# Altium footprint library MH_DA_THU_VIEN_16122016.PcbLib: 531 footprints (part 17 of 34)
Each footprint in its own frame and in the unit in brackets; x right, y up, seen from the top. Pads: shape width x height; smd on the part's side, far side on the other; paste and mask are expansions set on the pad; w line width, h text height; cw(c..) or ccw(c..) is an arc to the next point about the centre after c.
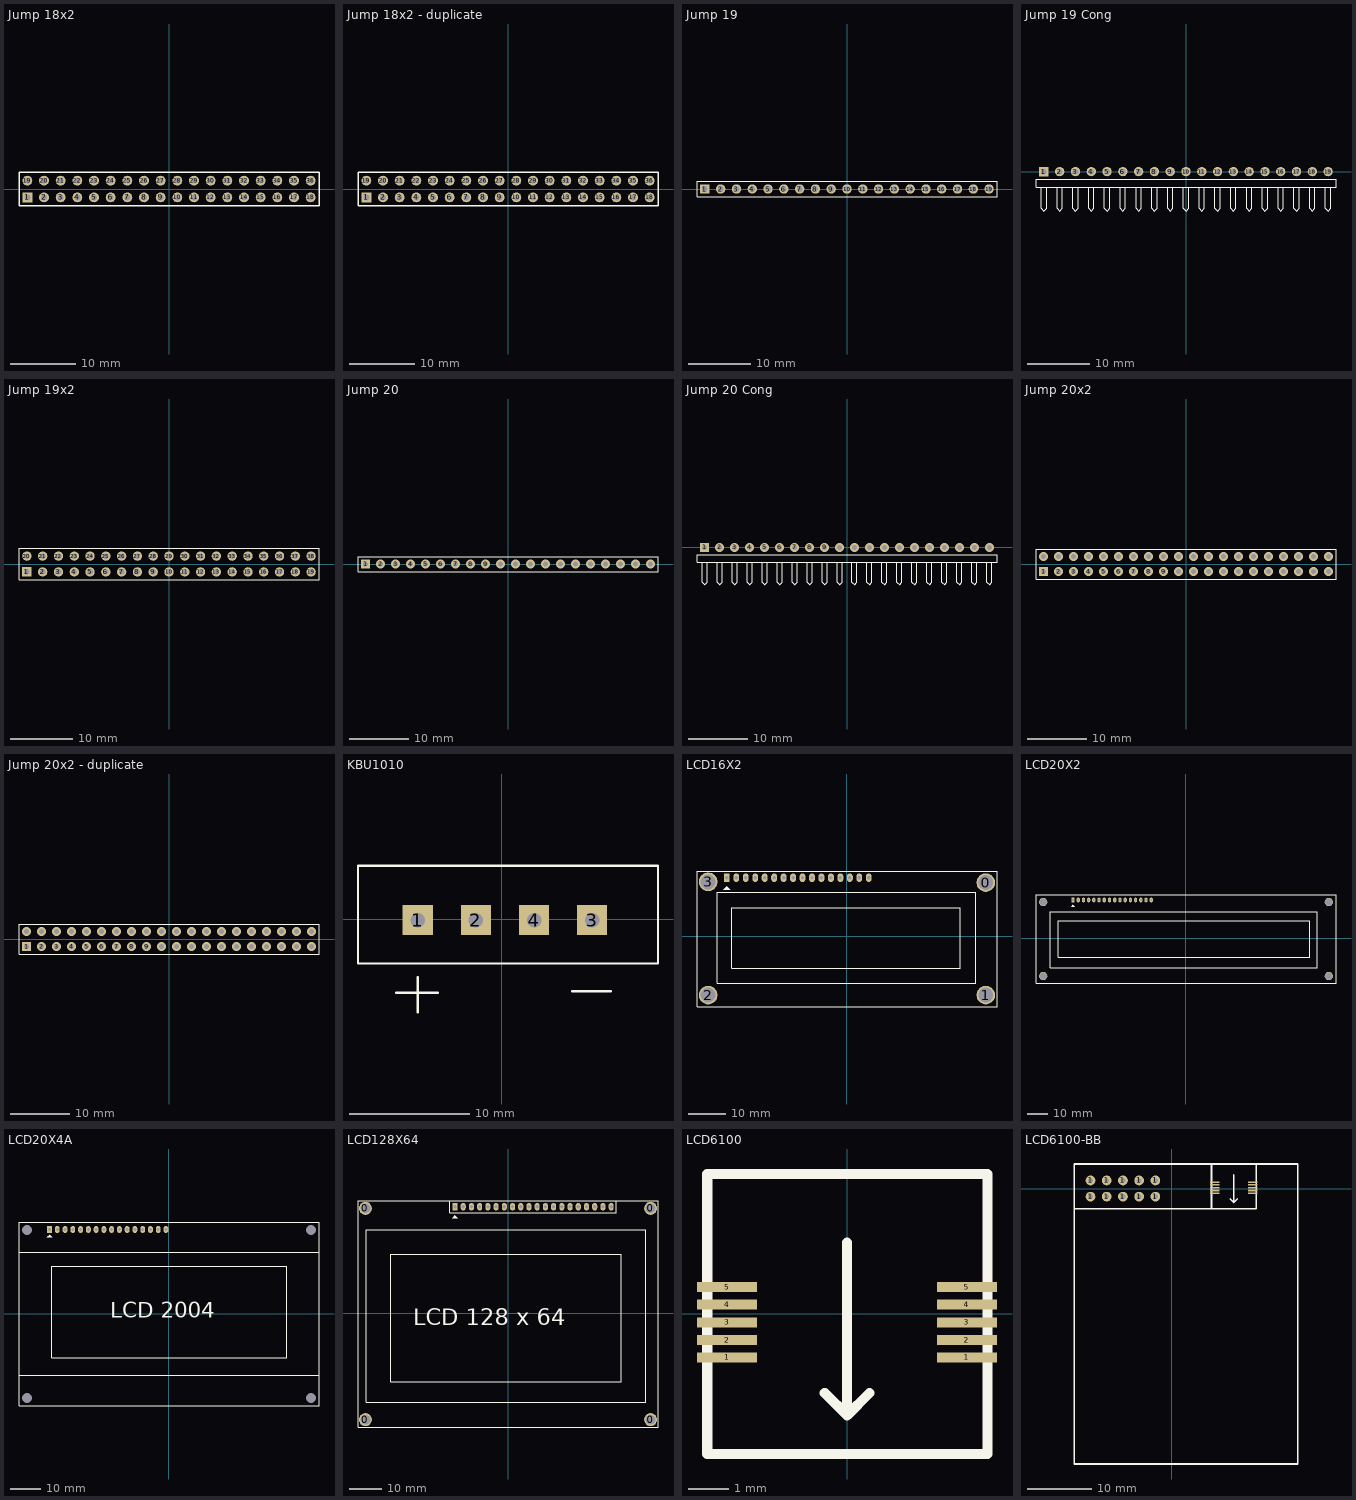
[diagram p16: the footprints below, top view; thin cyan lines are the x and y axes]

## Jump 18x2 [mm]
pads (36):
  rect 1.5x1.5 hole 0.9: 1(-21.59,-1.27)
  round 1.5 hole 0.9: 2(-19.05,-1.27) 3(-16.51,-1.27) 4(-13.97,-1.27) 5(-11.43,-1.27) 6(-8.89,-1.27) 7(-6.35,-1.27) 8(-3.81,-1.27) 9(-1.27,-1.27) 10(1.27,-1.27) 11(3.81,-1.27) 12(6.35,-1.27) 13(8.89,-1.27) 14(11.43,-1.27) 15(13.97,-1.27) 16(16.51,-1.27) 17(19.05,-1.27) 18(21.59,-1.27) 19(-21.59,1.27) 20(-19.05,1.27) 21(-16.51,1.27) 22(-13.97,1.27) 23(-11.43,1.27) 24(-8.89,1.27) 25(-6.35,1.27) 26(-3.81,1.27) 27(-1.27,1.27) 28(1.27,1.27) 29(3.81,1.27) 30(6.35,1.27) 31(8.89,1.27) 32(11.43,1.27) 33(13.97,1.27) 34(16.51,1.27) 35(19.05,1.27) 36(21.59,1.27)
Top Overlay:
  lines w0.2: -22.86,-2.54 -22.86,2.54 22.86,2.54 22.86,-2.54 -22.86,-2.54
3D body: height 1.5, standoff 0, extent 20.32,-2.54 22.86,0
3D body: height 1.5, standoff 0, extent 20.32,0 22.86,2.54
3D body: height 1.5, standoff 0, extent 15.24,-2.54 17.78,0
3D body: height 1.5, standoff 0, extent 15.24,0 17.78,2.54
3D body: height 1.5, standoff 0, extent 17.78,-2.54 20.32,0
3D body: height 1.5, standoff 0, extent 17.78,0 20.32,2.54
3D body: height 1.5, standoff 0, extent 10.16,-2.54 12.7,0
3D body: height 1.5, standoff 0, extent 10.16,0 12.7,2.54
3D body: height 1.5, standoff 0, extent 12.7,-2.54 15.24,0
3D body: height 1.5, standoff 0, extent 12.7,0 15.24,2.54
3D body: height 1.5, standoff 0, extent 5.08,-2.54 7.62,0
3D body: height 1.5, standoff 0, extent 5.08,0 7.62,2.54
3D body: height 1.5, standoff 0, extent 7.62,-2.54 10.16,0
3D body: height 1.5, standoff 0, extent 7.62,0 10.16,2.54
3D body: height 1.5, standoff 0, extent 2.54,0 5.08,2.54
3D body: height 1.5, standoff 0, extent 2.54,-2.54 5.08,0
3D body: height 1.5, standoff 0, extent 0,0 2.54,2.54
3D body: height 1.5, standoff 0, extent 0,-2.54 2.54,0
3D body: height 1.5, standoff 0, extent -2.54,0 0,2.54
3D body: height 1.5, standoff 0, extent -2.54,-2.54 0,0
3D body: height 1.5, standoff 0, extent -5.08,0 -2.54,2.54
3D body: height 1.5, standoff 0, extent -5.08,-2.54 -2.54,0
3D body: height 1.5, standoff 0, extent -7.62,0 -5.08,2.54
3D body: height 1.5, standoff 0, extent -7.62,-2.54 -5.08,0
3D body: height 1.5, standoff 0, extent -10.16,0 -7.62,2.54
3D body: height 1.5, standoff 0, extent -10.16,-2.54 -7.62,0
3D body: height 1.5, standoff 0, extent -12.7,0 -10.16,2.54
3D body: height 1.5, standoff 0, extent -12.7,-2.54 -10.16,0
3D body: height 1.5, standoff 0, extent -15.24,0 -12.7,2.54
3D body: height 1.5, standoff 0, extent -15.24,-2.54 -12.7,0
3D body: height 1.5, standoff 0, extent -17.78,0 -15.24,2.54
3D body: height 1.5, standoff 0, extent -17.78,-2.54 -15.24,0
3D body: height 1.5, standoff 0, extent -20.32,0 -17.78,2.54
3D body: height 1.5, standoff 0, extent -20.32,-2.54 -17.78,0
3D body: height 1.5, standoff 0, extent -22.86,0 -20.32,2.54
3D body: height 1.5, standoff 0, extent -22.86,-2.54 -20.32,0

## Jump 18x2 - duplicate [mm]
pads (36):
  rect 1.5x1.5 hole 0.9: 1(-21.59,-1.27)
  round 1.5 hole 0.9: 2(-19.05,-1.27) 3(-16.51,-1.27) 4(-13.97,-1.27) 5(-11.43,-1.27) 6(-8.89,-1.27) 7(-6.35,-1.27) 8(-3.81,-1.27) 9(-1.27,-1.27) 10(1.27,-1.27) 11(3.81,-1.27) 12(6.35,-1.27) 13(8.89,-1.27) 14(11.43,-1.27) 15(13.97,-1.27) 16(16.51,-1.27) 17(19.05,-1.27) 18(21.59,-1.27) 19(-21.59,1.27) 20(-19.05,1.27) 21(-16.51,1.27) 22(-13.97,1.27) 23(-11.43,1.27) 24(-8.89,1.27) 25(-6.35,1.27) 26(-3.81,1.27) 27(-1.27,1.27) 28(1.27,1.27) 29(3.81,1.27) 30(6.35,1.27) 31(8.89,1.27) 32(11.43,1.27) 33(13.97,1.27) 34(16.51,1.27) 35(19.05,1.27) 36(21.59,1.27)
Top Overlay:
  lines w0.2: -22.86,-2.54 -22.86,2.54 22.86,2.54 22.86,-2.54 -22.86,-2.54
3D body: height 1.5, standoff 0, extent 20.32,-2.54 22.86,0
3D body: height 1.5, standoff 0, extent 20.32,0 22.86,2.54
3D body: height 1.5, standoff 0, extent 15.24,-2.54 17.78,0
3D body: height 1.5, standoff 0, extent 15.24,0 17.78,2.54
3D body: height 1.5, standoff 0, extent 17.78,-2.54 20.32,0
3D body: height 1.5, standoff 0, extent 17.78,0 20.32,2.54
3D body: height 1.5, standoff 0, extent 10.16,-2.54 12.7,0
3D body: height 1.5, standoff 0, extent 10.16,0 12.7,2.54
3D body: height 1.5, standoff 0, extent 12.7,-2.54 15.24,0
3D body: height 1.5, standoff 0, extent 12.7,0 15.24,2.54
3D body: height 1.5, standoff 0, extent 5.08,-2.54 7.62,0
3D body: height 1.5, standoff 0, extent 5.08,0 7.62,2.54
3D body: height 1.5, standoff 0, extent 7.62,-2.54 10.16,0
3D body: height 1.5, standoff 0, extent 7.62,0 10.16,2.54
3D body: height 1.5, standoff 0, extent 2.54,0 5.08,2.54
3D body: height 1.5, standoff 0, extent 2.54,-2.54 5.08,0
3D body: height 1.5, standoff 0, extent 0,0 2.54,2.54
3D body: height 1.5, standoff 0, extent 0,-2.54 2.54,0
3D body: height 1.5, standoff 0, extent -2.54,0 0,2.54
3D body: height 1.5, standoff 0, extent -2.54,-2.54 0,0
3D body: height 1.5, standoff 0, extent -5.08,0 -2.54,2.54
3D body: height 1.5, standoff 0, extent -5.08,-2.54 -2.54,0
3D body: height 1.5, standoff 0, extent -7.62,0 -5.08,2.54
3D body: height 1.5, standoff 0, extent -7.62,-2.54 -5.08,0
3D body: height 1.5, standoff 0, extent -10.16,0 -7.62,2.54
3D body: height 1.5, standoff 0, extent -10.16,-2.54 -7.62,0
3D body: height 1.5, standoff 0, extent -12.7,0 -10.16,2.54
3D body: height 1.5, standoff 0, extent -12.7,-2.54 -10.16,0
3D body: height 1.5, standoff 0, extent -15.24,0 -12.7,2.54
3D body: height 1.5, standoff 0, extent -15.24,-2.54 -12.7,0
3D body: height 1.5, standoff 0, extent -17.78,0 -15.24,2.54
3D body: height 1.5, standoff 0, extent -17.78,-2.54 -15.24,0
3D body: height 1.5, standoff 0, extent -20.32,0 -17.78,2.54
3D body: height 1.5, standoff 0, extent -20.32,-2.54 -17.78,0
3D body: height 1.5, standoff 0, extent -22.86,0 -20.32,2.54
3D body: height 1.5, standoff 0, extent -22.86,-2.54 -20.32,0

## Jump 19 [mm]
pads (19):
  rect 1.5x1.5 hole 0.9: 1(-22.86,0)
  round 1.5 hole 0.9: 2(-20.32,0) 3(-17.78,0) 4(-15.24,0) 5(-12.7,0) 6(-10.16,0) 7(-7.62,0) 8(-5.08,0) 9(-2.54,0) 10(0,0) 11(2.54,0) 12(5.08,0) 13(7.62,0) 14(10.16,0) 15(12.7,0) 16(15.24,0) 17(17.78,0) 18(20.32,0) 19(22.86,0)
Top Overlay:
  lines w0.2: 14.605,1.27 14.817,1.27 ; -24.13,-1.27 -24.13,1.27 -22.225,1.27 24.13,1.27 24.13,-1.27 -24.13,-1.27
3D body: height 7, standoff -1, extent 14.834,-0.406 15.63,0.392
3D body: height 1.5, standoff 0, extent 13.97,-1.27 16.51,1.27
3D body: height 7, standoff -1, extent 17.374,-0.406 18.17,0.392
3D body: height 1.5, standoff 0, extent 16.51,-1.27 19.05,1.27
3D body: height 7, standoff -1, extent 19.914,-0.406 20.71,0.392
3D body: height 1.5, standoff 0, extent 19.05,-1.27 21.59,1.27
3D body: height 7, standoff -1, extent 2.134,-0.406 2.93,0.392
3D body: height 1.5, standoff 0, extent 1.27,-1.27 3.81,1.27
3D body: height 7, standoff -1, extent 4.674,-0.406 5.47,0.392
3D body: height 1.5, standoff 0, extent 3.81,-1.27 6.35,1.27
3D body: height 7, standoff -1, extent 7.214,-0.406 8.01,0.392
3D body: height 1.5, standoff 0, extent 6.35,-1.27 8.89,1.27
3D body: height 7, standoff -1, extent 9.754,-0.406 10.55,0.392
3D body: height 1.5, standoff 0, extent 8.89,-1.27 11.43,1.27
3D body: height 7, standoff -1, extent 12.294,-0.406 13.09,0.392
3D body: height 1.5, standoff 0, extent 11.43,-1.27 13.97,1.27
3D body: height 7, standoff -1, extent -10.566,-0.406 -9.77,0.392
3D body: height 1.5, standoff 0, extent -11.43,-1.27 -8.89,1.27
3D body: height 7, standoff -1, extent -8.026,-0.406 -7.23,0.392
3D body: height 1.5, standoff 0, extent -8.89,-1.27 -6.35,1.27
3D body: height 7, standoff -1, extent -5.486,-0.406 -4.69,0.392
3D body: height 1.5, standoff 0, extent -6.35,-1.27 -3.81,1.27
3D body: height 7, standoff -1, extent -2.946,-0.406 -2.15,0.392
3D body: height 1.5, standoff 0, extent -3.81,-1.27 -1.27,1.27
3D body: height 7, standoff -1, extent -0.406,-0.406 0.39,0.392
3D body: height 1.5, standoff 0, extent -1.27,-1.27 1.27,1.27
3D body: height 7, standoff -1, extent -23.266,-0.406 -22.47,0.392
3D body: height 1.5, standoff 0, extent -24.13,-1.27 -21.59,1.27
3D body: height 7, standoff -1, extent -20.726,-0.406 -19.93,0.392
3D body: height 1.5, standoff 0, extent -21.59,-1.27 -19.05,1.27
3D body: height 7, standoff -1, extent -18.186,-0.406 -17.39,0.392
3D body: height 1.5, standoff 0, extent -19.05,-1.27 -16.51,1.27
3D body: height 7, standoff -1, extent -15.646,-0.406 -14.85,0.392
3D body: height 1.5, standoff 0, extent -16.51,-1.27 -13.97,1.27
3D body: height 7, standoff -1, extent -13.106,-0.406 -12.31,0.392
3D body: height 1.5, standoff 0, extent -13.97,-1.27 -11.43,1.27
3D body: height 7, standoff -1, extent 22.454,-0.406 23.25,0.392
3D body: height 1.5, standoff 0, extent 21.59,-1.27 24.13,1.27

## Jump 19 Cong [mm]
pads (19):
  rect 1.5x1.5 hole 0.9: 1(-22.86,0)
  round 1.5 hole 0.9: 2(-20.32,0) 3(-17.78,0) 4(-15.24,0) 5(-12.7,0) 6(-10.16,0) 7(-7.62,0) 8(-5.08,0) 9(-2.54,0) 10(0,0) 11(2.54,0) 12(5.08,0) 13(7.62,0) 14(10.16,0) 15(12.7,0) 16(15.24,0) 17(17.78,0) 18(20.32,0) 19(22.86,0)
Top Overlay:
  lines w0.2: -23.283,-2.54 -23.283,-5.927 -22.86,-6.35 -22.437,-5.927 -22.437,-2.54 ; -20.743,-2.54 -20.743,-5.927 -20.32,-6.35 -19.897,-5.927 -19.897,-2.54 ; -18.203,-2.54 -18.203,-5.927 -17.78,-6.35 -17.357,-5.927 -17.357,-2.54 ; -15.663,-2.54 -15.663,-5.927 -15.24,-6.35 -14.817,-5.927 -14.817,-2.54 ; -13.123,-2.54 -13.123,-5.927 -12.7,-6.35 -12.277,-5.927 -12.277,-2.54 ; -10.583,-2.54 -10.583,-5.927 -10.16,-6.35 -9.737,-5.927 -9.737,-2.54 ; -8.043,-2.54 -8.043,-5.927 -7.62,-6.35 -7.197,-5.927 -7.197,-2.54 ; -5.503,-2.54 -5.503,-5.927 -5.08,-6.35 -4.657,-5.927 -4.657,-2.54 ; -2.963,-2.54 -2.963,-5.927 -2.54,-6.35 -2.117,-5.927 -2.117,-2.54 ; -0.423,-2.54 -0.423,-5.927 0,-6.35 0.423,-5.927 0.423,-2.54 ; 2.117,-2.54 2.117,-5.927 2.54,-6.35 2.963,-5.927 2.963,-2.54 ; 4.657,-2.54 4.657,-5.927 5.08,-6.35 5.503,-5.927 5.503,-2.54 ; 7.197,-2.54 7.197,-5.927 7.62,-6.35 8.043,-5.927 8.043,-2.54 ; 9.737,-2.54 9.737,-5.927 10.16,-6.35 10.583,-5.927 10.583,-2.54 ; 12.277,-2.54 12.277,-5.927 12.7,-6.35 13.123,-5.927 13.123,-2.54 ; 14.817,-2.54 14.817,-5.927 15.24,-6.35 15.663,-5.927 15.663,-2.54 ; 17.357,-2.54 17.357,-5.927 17.78,-6.35 18.203,-5.927 18.203,-2.54 ; 19.897,-2.54 19.897,-5.927 20.32,-6.35 20.743,-5.927 20.743,-2.54 ; 22.437,-2.54 22.437,-5.927 22.86,-6.35 23.283,-5.927 23.283,-2.54 ; -24.13,-2.54 24.13,-2.54 24.13,-1.27 -22.225,-1.27 -24.13,-1.27 -24.13,-2.54
3D body: height 4.33, standoff -3, extent 11.43,-7 16.51,1.27
3D body: height 4.33, standoff -3, extent 6.35,-7 11.43,1.27
3D body: height 4.33, standoff -3, extent 1.27,-7 6.35,1.27
3D body: height 4.33, standoff -3, extent -3.81,-7 1.27,1.27
3D body: height 4.33, standoff -3, extent -8.89,-7 -3.81,1.27
3D body: height 4.33, standoff -3, extent -13.97,-7 -8.89,1.27
3D body: height 4.33, standoff -3, extent -19.05,-7 -13.97,1.27
3D body: height 4.33, standoff -3, extent -24.13,-7 -19.05,1.27
3D body: height 4.33, standoff -3, extent 16.51,-7 24.13,1.27

## Jump 19x2 [mm]
pads (38):
  rect 1.5x1.5 hole 0.9: 1(-22.86,-1.27)
  round 1.5 hole 0.9: 2(-20.32,-1.27) 3(-17.78,-1.27) 4(-15.24,-1.27) 5(-12.7,-1.27) 6(-10.16,-1.27) 7(-7.62,-1.27) 8(-5.08,-1.27) 9(-2.54,-1.27) 10(0,-1.27) 11(2.54,-1.27) 12(5.08,-1.27) 13(7.62,-1.27) 14(10.16,-1.27) 15(12.7,-1.27) 16(15.24,-1.27) 17(17.78,-1.27) 18(20.32,-1.27) 19(22.86,-1.27) 20(-22.86,1.27) 21(-20.32,1.27) 22(-17.78,1.27) 23(-15.24,1.27) 24(-12.7,1.27) 25(-10.16,1.27) 26(-7.62,1.27) 27(-5.08,1.27) 28(-2.54,1.27) 29(0,1.27) 30(2.54,1.27) 31(5.08,1.27) 32(7.62,1.27) 33(10.16,1.27) 34(12.7,1.27) 35(15.24,1.27) 36(17.78,1.27) 37(20.32,1.27) 38(22.86,1.27)
Top Overlay:
  lines w0.2: -24.13,-2.54 -24.13,2.54 24.13,2.54 24.13,-2.54 -24.13,-2.54
3D body: height 1.5, standoff 0, extent 19.05,-2.54 21.59,0
3D body: height 1.5, standoff 0, extent 19.05,0 21.59,2.54
3D body: height 1.5, standoff 0, extent 21.59,-2.54 24.13,0
3D body: height 1.5, standoff 0, extent 21.59,0 24.13,2.54
3D body: height 1.5, standoff 0, extent 13.97,-2.54 16.51,0
3D body: height 1.5, standoff 0, extent 13.97,0 16.51,2.54
3D body: height 1.5, standoff 0, extent 16.51,-2.54 19.05,0
3D body: height 1.5, standoff 0, extent 16.51,0 19.05,2.54
3D body: height 1.5, standoff 0, extent 8.89,-2.54 11.43,0
3D body: height 1.5, standoff 0, extent 8.89,0 11.43,2.54
3D body: height 1.5, standoff 0, extent 11.43,-2.54 13.97,0
3D body: height 1.5, standoff 0, extent 11.43,0 13.97,2.54
3D body: height 1.5, standoff 0, extent 3.81,-2.54 6.35,0
3D body: height 1.5, standoff 0, extent 3.81,0 6.35,2.54
3D body: height 1.5, standoff 0, extent 6.35,-2.54 8.89,0
3D body: height 1.5, standoff 0, extent 6.35,0 8.89,2.54
3D body: height 1.5, standoff 0, extent 1.27,0 3.81,2.54
3D body: height 1.5, standoff 0, extent 1.27,-2.54 3.81,0
3D body: height 1.5, standoff 0, extent -1.27,0 1.27,2.54
3D body: height 1.5, standoff 0, extent -1.27,-2.54 1.27,0
3D body: height 1.5, standoff 0, extent -3.81,0 -1.27,2.54
3D body: height 1.5, standoff 0, extent -3.81,-2.54 -1.27,0
3D body: height 1.5, standoff 0, extent -6.35,0 -3.81,2.54
3D body: height 1.5, standoff 0, extent -6.35,-2.54 -3.81,0
3D body: height 1.5, standoff 0, extent -8.89,0 -6.35,2.54
3D body: height 1.5, standoff 0, extent -8.89,-2.54 -6.35,0
3D body: height 1.5, standoff 0, extent -11.43,0 -8.89,2.54
3D body: height 1.5, standoff 0, extent -11.43,-2.54 -8.89,0
3D body: height 1.5, standoff 0, extent -13.97,0 -11.43,2.54
3D body: height 1.5, standoff 0, extent -13.97,-2.54 -11.43,0
3D body: height 1.5, standoff 0, extent -16.51,0 -13.97,2.54
3D body: height 1.5, standoff 0, extent -16.51,-2.54 -13.97,0
3D body: height 1.5, standoff 0, extent -19.05,0 -16.51,2.54
3D body: height 1.5, standoff 0, extent -19.05,-2.54 -16.51,0
3D body: height 1.5, standoff 0, extent -21.59,0 -19.05,2.54
3D body: height 1.5, standoff 0, extent -21.59,-2.54 -19.05,0
3D body: height 1.5, standoff 0, extent -24.13,0 -21.59,2.54
3D body: height 1.5, standoff 0, extent -24.13,-2.54 -21.59,0

## Jump 20 [mm]
pads (20):
  rect 1.5x1.5 hole 0.9: 1(-24.13,0)
  round 1.5 hole 0.9: 2(-21.59,0) 3(-19.05,0) 4(-16.51,0) 5(-13.97,0) 6(-11.43,0) 7(-8.89,0) 8(-6.35,0) 9(-3.81,0) 10(-1.27,0) 11(1.27,0) 12(3.81,0) 13(6.35,0) 14(8.89,0) 15(11.43,0) 16(13.97,0) 17(16.51,0) 18(19.05,0) 19(21.59,0) 20(24.13,0)
Top Overlay:
  lines w0.2: -25.4,-1.27 -25.4,1.27 -23.495,1.27 25.4,1.27 25.4,-1.27 -25.4,-1.27

## Jump 20 Cong [mm]
pads (20):
  rect 1.5x1.5 hole 0.9: 1(-24.13,0)
  round 1.5 hole 0.9: 2(-21.59,0) 3(-19.05,0) 4(-16.51,0) 5(-13.97,0) 6(-11.43,0) 7(-8.89,0) 8(-6.35,0) 9(-3.81,0) 10(-1.27,0) 11(1.27,0) 12(3.81,0) 13(6.35,0) 14(8.89,0) 15(11.43,0) 16(13.97,0) 17(16.51,0) 18(19.05,0) 19(21.59,0) 20(24.13,0)
Top Overlay:
  lines w0.2: -24.553,-2.54 -24.553,-5.927 -24.13,-6.35 -23.707,-5.927 -23.707,-2.54 ; -22.013,-2.54 -22.013,-5.927 -21.59,-6.35 -21.167,-5.927 -21.167,-2.54 ; -19.473,-2.54 -19.473,-5.927 -19.05,-6.35 -18.627,-5.927 -18.627,-2.54 ; -16.933,-2.54 -16.933,-5.927 -16.51,-6.35 -16.087,-5.927 -16.087,-2.54 ; -14.393,-2.54 -14.393,-5.927 -13.97,-6.35 -13.547,-5.927 -13.547,-2.54 ; -11.853,-2.54 -11.853,-5.927 -11.43,-6.35 -11.007,-5.927 -11.007,-2.54 ; -9.313,-2.54 -9.313,-5.927 -8.89,-6.35 -8.467,-5.927 -8.467,-2.54 ; -6.773,-2.54 -6.773,-5.927 -6.35,-6.35 -5.927,-5.927 -5.927,-2.54 ; -4.233,-2.54 -4.233,-5.927 -3.81,-6.35 -3.387,-5.927 -3.387,-2.54 ; -1.693,-2.54 -1.693,-5.927 -1.27,-6.35 -0.847,-5.927 -0.847,-2.54 ; 0.847,-2.54 0.847,-5.927 1.27,-6.35 1.693,-5.927 1.693,-2.54 ; 3.387,-2.54 3.387,-5.927 3.81,-6.35 4.233,-5.927 4.233,-2.54 ; 5.927,-2.54 5.927,-5.927 6.35,-6.35 6.773,-5.927 6.773,-2.54 ; 8.467,-2.54 8.467,-5.927 8.89,-6.35 9.313,-5.927 9.313,-2.54 ; 11.007,-2.54 11.007,-5.927 11.43,-6.35 11.853,-5.927 11.853,-2.54 ; 13.547,-2.54 13.547,-5.927 13.97,-6.35 14.393,-5.927 14.393,-2.54 ; 16.087,-2.54 16.087,-5.927 16.51,-6.35 16.933,-5.927 16.933,-2.54 ; 18.627,-2.54 18.627,-5.927 19.05,-6.35 19.473,-5.927 19.473,-2.54 ; 21.167,-2.54 21.167,-5.927 21.59,-6.35 22.013,-5.927 22.013,-2.54 ; 23.707,-2.54 23.707,-5.927 24.13,-6.35 24.553,-5.927 24.553,-2.54 ; -25.4,-2.54 -25.4,-1.27 -23.495,-1.27 25.4,-1.27 25.4,-2.54 -25.4,-2.54
3D body: height 4.33, standoff -3, extent -25.4,-7 -20.32,1.27
3D body: height 4.33, standoff -3, extent -20.32,-7 -15.24,1.27
3D body: height 4.33, standoff -3, extent -15.24,-7 -10.16,1.27
3D body: height 4.33, standoff -3, extent -10.16,-7 -5.08,1.27
3D body: height 4.33, standoff -3, extent -5.08,-7 0,1.27
3D body: height 4.33, standoff -3, extent 0,-7 5.08,1.27
3D body: height 4.33, standoff -3, extent 5.08,-7 10.16,1.27
3D body: height 4.33, standoff -3, extent 10.16,-7 15.24,1.27
3D body: height 4.33, standoff -3, extent 15.24,-7 20.32,1.27
3D body: height 4.33, standoff -3, extent 20.32,-7 25.4,1.27

## Jump 20x2 [mm]
pads (40):
  rect 1.5x1.5 hole 0.9: 1(-24.13,-1.27)
  round 1.5 hole 0.9: 2(-21.59,-1.27) 3(-19.05,-1.27) 4(-16.51,-1.27) 5(-13.97,-1.27) 6(-11.43,-1.27) 7(-8.89,-1.27) 8(-6.35,-1.27) 9(-3.81,-1.27) 10(-1.27,-1.27) 11(1.27,-1.27) 12(3.81,-1.27) 13(6.35,-1.27) 14(8.89,-1.27) 15(11.43,-1.27) 16(13.97,-1.27) 17(16.51,-1.27) 18(19.05,-1.27) 19(21.59,-1.27) 20(24.13,-1.27) 21(-24.13,1.27) 22(-21.59,1.27) 23(-19.05,1.27) 24(-16.51,1.27) 25(-13.97,1.27) 26(-11.43,1.27) 27(-8.89,1.27) 28(-6.35,1.27) 29(-3.81,1.27) 30(-1.27,1.27) 31(1.27,1.27) 32(3.81,1.27) 33(6.35,1.27) 34(8.89,1.27) 35(11.43,1.27) 36(13.97,1.27) 37(16.51,1.27) 38(19.05,1.27) 39(21.59,1.27) 40(24.13,1.27)
Top Overlay:
  lines w0.2: -25.4,-2.54 25.4,-2.54 25.4,2.54 -25.4,2.54 -25.4,-2.54
3D body: height 1.5, standoff 0, extent 22.86,-2.54 25.4,0
3D body: height 1.5, standoff 0, extent 22.86,0 25.4,2.54
3D body: height 1.5, standoff 0, extent 17.78,-2.54 20.32,0
3D body: height 1.5, standoff 0, extent 17.78,0 20.32,2.54
3D body: height 1.5, standoff 0, extent 20.32,-2.54 22.86,0
3D body: height 1.5, standoff 0, extent 20.32,0 22.86,2.54
3D body: height 1.5, standoff 0, extent 12.7,-2.54 15.24,0
3D body: height 1.5, standoff 0, extent 12.7,0 15.24,2.54
3D body: height 1.5, standoff 0, extent 15.24,-2.54 17.78,0
3D body: height 1.5, standoff 0, extent 15.24,0 17.78,2.54
3D body: height 1.5, standoff 0, extent 7.62,-2.54 10.16,0
3D body: height 1.5, standoff 0, extent 7.62,0 10.16,2.54
3D body: height 1.5, standoff 0, extent 10.16,-2.54 12.7,0
3D body: height 1.5, standoff 0, extent 10.16,0 12.7,2.54
3D body: height 1.5, standoff 0, extent 2.54,-2.54 5.08,0
3D body: height 1.5, standoff 0, extent 2.54,0 5.08,2.54
3D body: height 1.5, standoff 0, extent 5.08,-2.54 7.62,0
3D body: height 1.5, standoff 0, extent 5.08,0 7.62,2.54
3D body: height 1.5, standoff 0, extent -25.4,-2.54 -22.86,0
3D body: height 1.5, standoff 0, extent -25.4,0 -22.86,2.54
3D body: height 1.5, standoff 0, extent -22.86,-2.54 -20.32,0
3D body: height 1.5, standoff 0, extent -22.86,0 -20.32,2.54
3D body: height 1.5, standoff 0, extent -20.32,-2.54 -17.78,0
3D body: height 1.5, standoff 0, extent -20.32,0 -17.78,2.54
3D body: height 1.5, standoff 0, extent -17.78,-2.54 -15.24,0
3D body: height 1.5, standoff 0, extent -17.78,0 -15.24,2.54
3D body: height 1.5, standoff 0, extent -15.24,-2.54 -12.7,0
3D body: height 1.5, standoff 0, extent -15.24,0 -12.7,2.54
3D body: height 1.5, standoff 0, extent -12.7,-2.54 -10.16,0
3D body: height 1.5, standoff 0, extent -12.7,0 -10.16,2.54
3D body: height 1.5, standoff 0, extent -10.16,-2.54 -7.62,0
3D body: height 1.5, standoff 0, extent -10.16,0 -7.62,2.54
3D body: height 1.5, standoff 0, extent -7.62,-2.54 -5.08,0
3D body: height 1.5, standoff 0, extent -7.62,0 -5.08,2.54
3D body: height 1.5, standoff 0, extent -5.08,-2.54 -2.54,0
3D body: height 1.5, standoff 0, extent -5.08,0 -2.54,2.54
3D body: height 1.5, standoff 0, extent -2.54,-2.54 0,0
3D body: height 1.5, standoff 0, extent -2.54,0 0,2.54
3D body: height 1.5, standoff 0, extent 0,-2.54 2.54,0
3D body: height 1.5, standoff 0, extent 0,0 2.54,2.54

## Jump 20x2 - duplicate [mm]
pads (40):
  rect 1.5x1.5 hole 0.9: 1(-24.13,-1.27)
  round 1.5 hole 0.9: 2(-21.59,-1.27) 3(-19.05,-1.27) 4(-16.51,-1.27) 5(-13.97,-1.27) 6(-11.43,-1.27) 7(-8.89,-1.27) 8(-6.35,-1.27) 9(-3.81,-1.27) 10(-1.27,-1.27) 11(1.27,-1.27) 12(3.81,-1.27) 13(6.35,-1.27) 14(8.89,-1.27) 15(11.43,-1.27) 16(13.97,-1.27) 17(16.51,-1.27) 18(19.05,-1.27) 19(21.59,-1.27) 20(24.13,-1.27) 21(-24.13,1.27) 22(-21.59,1.27) 23(-19.05,1.27) 24(-16.51,1.27) 25(-13.97,1.27) 26(-11.43,1.27) 27(-8.89,1.27) 28(-6.35,1.27) 29(-3.81,1.27) 30(-1.27,1.27) 31(1.27,1.27) 32(3.81,1.27) 33(6.35,1.27) 34(8.89,1.27) 35(11.43,1.27) 36(13.97,1.27) 37(16.51,1.27) 38(19.05,1.27) 39(21.59,1.27) 40(24.13,1.27)
Top Overlay:
  lines w0.2: -25.4,-2.54 25.4,-2.54 25.4,2.54 -25.4,2.54 -25.4,-2.54
3D body: height 1.5, standoff 0, extent 22.86,-2.54 25.4,0
3D body: height 1.5, standoff 0, extent 22.86,0 25.4,2.54
3D body: height 1.5, standoff 0, extent 17.78,-2.54 20.32,0
3D body: height 1.5, standoff 0, extent 17.78,0 20.32,2.54
3D body: height 1.5, standoff 0, extent 20.32,-2.54 22.86,0
3D body: height 1.5, standoff 0, extent 20.32,0 22.86,2.54
3D body: height 1.5, standoff 0, extent 12.7,-2.54 15.24,0
3D body: height 1.5, standoff 0, extent 12.7,0 15.24,2.54
3D body: height 1.5, standoff 0, extent 15.24,-2.54 17.78,0
3D body: height 1.5, standoff 0, extent 15.24,0 17.78,2.54
3D body: height 1.5, standoff 0, extent 7.62,-2.54 10.16,0
3D body: height 1.5, standoff 0, extent 7.62,0 10.16,2.54
3D body: height 1.5, standoff 0, extent 10.16,-2.54 12.7,0
3D body: height 1.5, standoff 0, extent 10.16,0 12.7,2.54
3D body: height 1.5, standoff 0, extent 2.54,-2.54 5.08,0
3D body: height 1.5, standoff 0, extent 2.54,0 5.08,2.54
3D body: height 1.5, standoff 0, extent 5.08,-2.54 7.62,0
3D body: height 1.5, standoff 0, extent 5.08,0 7.62,2.54
3D body: height 1.5, standoff 0, extent -25.4,-2.54 -22.86,0
3D body: height 1.5, standoff 0, extent -25.4,0 -22.86,2.54
3D body: height 1.5, standoff 0, extent -22.86,-2.54 -20.32,0
3D body: height 1.5, standoff 0, extent -22.86,0 -20.32,2.54
3D body: height 1.5, standoff 0, extent -20.32,-2.54 -17.78,0
3D body: height 1.5, standoff 0, extent -20.32,0 -17.78,2.54
3D body: height 1.5, standoff 0, extent -17.78,-2.54 -15.24,0
3D body: height 1.5, standoff 0, extent -17.78,0 -15.24,2.54
3D body: height 1.5, standoff 0, extent -15.24,-2.54 -12.7,0
3D body: height 1.5, standoff 0, extent -15.24,0 -12.7,2.54
3D body: height 1.5, standoff 0, extent -12.7,-2.54 -10.16,0
3D body: height 1.5, standoff 0, extent -12.7,0 -10.16,2.54
3D body: height 1.5, standoff 0, extent -10.16,-2.54 -7.62,0
3D body: height 1.5, standoff 0, extent -10.16,0 -7.62,2.54
3D body: height 1.5, standoff 0, extent -7.62,-2.54 -5.08,0
3D body: height 1.5, standoff 0, extent -7.62,0 -5.08,2.54
3D body: height 1.5, standoff 0, extent -5.08,-2.54 -2.54,0
3D body: height 1.5, standoff 0, extent -5.08,0 -2.54,2.54
3D body: height 1.5, standoff 0, extent -2.54,-2.54 0,0
3D body: height 1.5, standoff 0, extent -2.54,0 0,2.54
3D body: height 1.5, standoff 0, extent 0,-2.54 2.54,0
3D body: height 1.5, standoff 0, extent 0,0 2.54,2.54

## KBU1010 [mm]
pads (4):
  rect 2.5x2.5 / inner round 1.575 / far side rect 2.5x2.5 hole 1.2: 1(-6.985,-0.086) 2(-2.159,-0.086) 3(7.493,-0.086) 4(2.667,-0.086)
Top Overlay:
  lines w0.203: -8.763,-6.096 -5.334,-6.096 ; -6.985,-7.747 -6.985,-4.826 ; 5.842,-5.969 9.017,-5.969 ; -11.938,-3.683 12.954,-3.683 12.954,4.445 -11.938,4.445 -11.938,-3.683
3D body: height 8.65, standoff -33.65, extent -11.219,-3.302 11.981,3.648

## LCD16X2 [mm] "LCD dipslay 16x2, 16 pin"
height 10.16
pads (20):
  round 5 hole 4: 0(37.25,14.45) 1(37.25,-15.75) 2(-37.25,-15.75) 3(-37.25,14.65)
  rect 1.575x2.286 hole 0.914: 1(-32.25,15.75)
  oval 1.575x2.286 hole 0.914: 2(-29.71,15.75) 3(-27.17,15.75) 4(-24.63,15.75) 5(-22.09,15.75) 6(-19.55,15.75) 7(-17.01,15.75) 8(-14.47,15.75) 9(-11.93,15.75) 10(-9.39,15.75) 11(-6.85,15.75) 12(-4.31,15.75) 13(-1.77,15.75) 14(0.77,15.75) 15(3.31,15.75) 16(5.85,15.75)
Top Overlay:
  region: -32.25,13.464 -33.139,12.575 -31.361,12.575
  lines w0.178: -40.251,-18.921 -40.251,17.528 40.267,17.528 40.267,-18.921 -40.251,-18.921 ; -34.79,-12.571 -34.79,11.813 34.552,11.813 34.552,-12.571 -34.79,-12.571 ; -30.98,-8.507 -30.98,7.749 30.361,7.749 30.361,-8.507 -30.98,-8.507
3D body: height 13.06, standoff -0.15, extent -40.242,-18.794 40.258,17.706

## LCD20X2 [mm] "LCD dipslay 20x2, 16 pin"
height 10.16
pads (20):
  rect 1.575x2.286 hole 0.914: 1(-55,18.5)
  oval 1.575x2.286 hole 0.914: 2(-52.46,18.5) 3(-49.92,18.5) 4(-47.38,18.5) 5(-44.84,18.5) 6(-42.3,18.5) 7(-39.76,18.5) 8(-37.22,18.5) 9(-34.68,18.5) 10(-32.14,18.5) 11(-29.6,18.5) 12(-27.06,18.5) 13(-24.52,18.5) 14(-21.98,18.5) 15(-19.44,18.5) 16(-16.9,18.5)
  round 4 hole 3.5: "Hole 0"(-69.5,-18.5) "Hole 0"(-69.5,17.5) "Hole 0"(69.5,-18.5) "Hole 0"(69.5,17.5)
Top Overlay:
  region: -55,16.214 -55.889,15.325 -54.111,15.325
  lines w0.178: -73,-22 -73,21.04 73,21.04 73,-22 -73,-22 ; -66.074,-14.52 -66.074,12.785 63.923,12.785 63.923,-14.52 -66.074,-14.52 ; -62.264,-9.44 -62.264,8.34 60.113,8.34 60.113,-9.44 -62.264,-9.44
3D body: height 5.03, standoff -4.57, extent -57.54,-18 58.538,19.338

## LCD20X4A [mil] "LCD dipslay 20x4, 16 pin"
height 400
pads (20):
  round 0 hole 125.98: 0(-1830.71,-1085.94) 0(-1830.71,1079.41) 0(1830.71,-1085.94) 0(1830.71,1079.41)
  rect 62x90 hole 39: 1(-1539.37,1085.94)
  oval 62x90 hole 39: 2(-1439.37,1085.94) 3(-1339.37,1085.94) 4(-1239.37,1085.94) 5(-1139.37,1085.94) 6(-1039.37,1085.94) 7(-939.37,1085.94) 8(-839.37,1085.94) 9(-739.37,1085.94) 10(-639.37,1085.94) 11(-539.37,1085.94) 12(-439.37,1085.94) 13(-339.37,1085.94) 14(-239.37,1085.94) 15(-139.37,1085.94) 16(-39.37,1085.94)
Top Overlay:
  region: -1539.07,1020.63 -1574.07,985.63 -1504.07,985.63
  lines w7: -1933.07,-790.67 1933.07,-790.67 ; -1933.07,790.04 1933.07,790.04 ; -1508.07,-569.68 1516.93,-569.68 1516.93,613.32 -1508.07,613.32 ; -1508.07,-569.37 -1508.07,610.63 ; -1933.07,-1184.37 -1933.07,1177.83 1933.07,1177.83 1933.07,-1184.37 -1933.07,-1184.37
  text "LCD 2004" at -758.07,-49.37 h200
3D body: height 517.32, standoff -25.98, extent -1929.07,-1187.57 1929.2,1174.63

## LCD128X64 [mil] "LCD Graphic 128x64, 20 pin"
height 400
pads (24):
  round 157.48 hole 118.11: 0(-1735,-1295) 0(-1735,1275) 0(1735,-1295) 0(1735,1275)
  rect 62x90 hole 39: 1(-645,1295)
  oval 62x90 hole 39: 2(-545,1295) 3(-445,1295) 4(-345,1295) 5(-245,1295) 6(-145,1295) 7(-45,1295) 8(55,1295) 9(155,1295) 10(255,1295) 11(355,1295) 12(455,1295) 13(555,1295) 14(655,1295) 15(755,1295) 16(855,1295) 17(955,1295) 18(1055,1295) 19(1155,1295) 20(1255,1295)
Top Overlay:
  region: -645,1190 -680,1155 -610,1155
  lines w7: -710,1224 -710,1365 1320,1365 1320,1224 -710,1224
  lines w10: -1825,-1385 -1825,1365 -1815,1365 1315,1365 1825,1365 1825,-1385 -1825,-1385 ; -1725,-1085 -1725,1015 1675,1015 1675,-1085 -1725,-1085 ; -1425,-835 -1425,715 1375,715 1375,-835 -1425,-835
  text "LCD 128 x 64" at -1150,-145 h200
3D body: height 234.65, standoff -157.48, extent -1827.68,-1392.95 1837.68,1362.96

## LCD6100 [mm]
pads (10):
  rect 1.5x0.25 smd: 1(-3,-1.091) 1(2.994,-1.091) 2(-3,-0.66) 2(2.994,-0.66) 3(-3,-0.215) 3(2.994,-0.215) 4(-3,0.229) 4(2.994,0.229) 5(-3,0.661) 5(2.994,0.661)
Top Overlay:
  lines w0.254: -0.559,-1.981 0,-2.54 ; 0,1.778 0,-2.54 ; 0.559,-1.981 0,-2.54 ; -3.493,-3.507 -3.493,3.493 3.507,3.493 3.507,-3.507 -3.493,-3.507

## LCD6100-BB [mil]
pads (20):
  round 60 hole 30: 1(-500.91,-50) 1(-500.91,50) 1(-400.91,-50) 1(-400.91,50) 1(-300.91,-50) 1(-300.91,50) 1(-200.91,-50) 1(-200.91,50) 1(-100.91,-50) 1(-100.91,50)
  rect 59.06x9.84 smd: 1(264.91,-29.08) 1(500.91,-29.08) 2(264.91,-12.08) 2(500.91,-12.08) 3(264.91,5.42) 3(500.91,5.42) 4(264.91,22.92) 4(500.91,22.92) 5(264.91,39.92) 5(500.91,39.92)
Top Overlay:
  lines w10: -600.91,-1699 777.04,-1699 777.04,150.39 ; -600.91,-1698 -600.91,151.39 777.04,151.39 ; -600.91,-124.2 521.13,-124.2 ; 361.04,-64.11 383.04,-86.11 ; 383.04,83.89 383.04,-86.11 ; 405.04,-64.11 383.04,-86.11 ; 521.13,-124.2 245.54,-124.2 245.54,151.39 521.13,151.39 521.13,-124.2